# Altium footprint library TarabusLibrary.PcbLib: 591 footprints (part 37 of 37)
Each footprint in its own frame and in the unit in brackets; x right, y up, seen from the top. Pads: shape width x height; smd on the part's side, far side on the other; paste and mask are expansions set on the pad; w line width, h text height; cw(c..) or ccw(c..) is an arc to the next point about the centre after c.
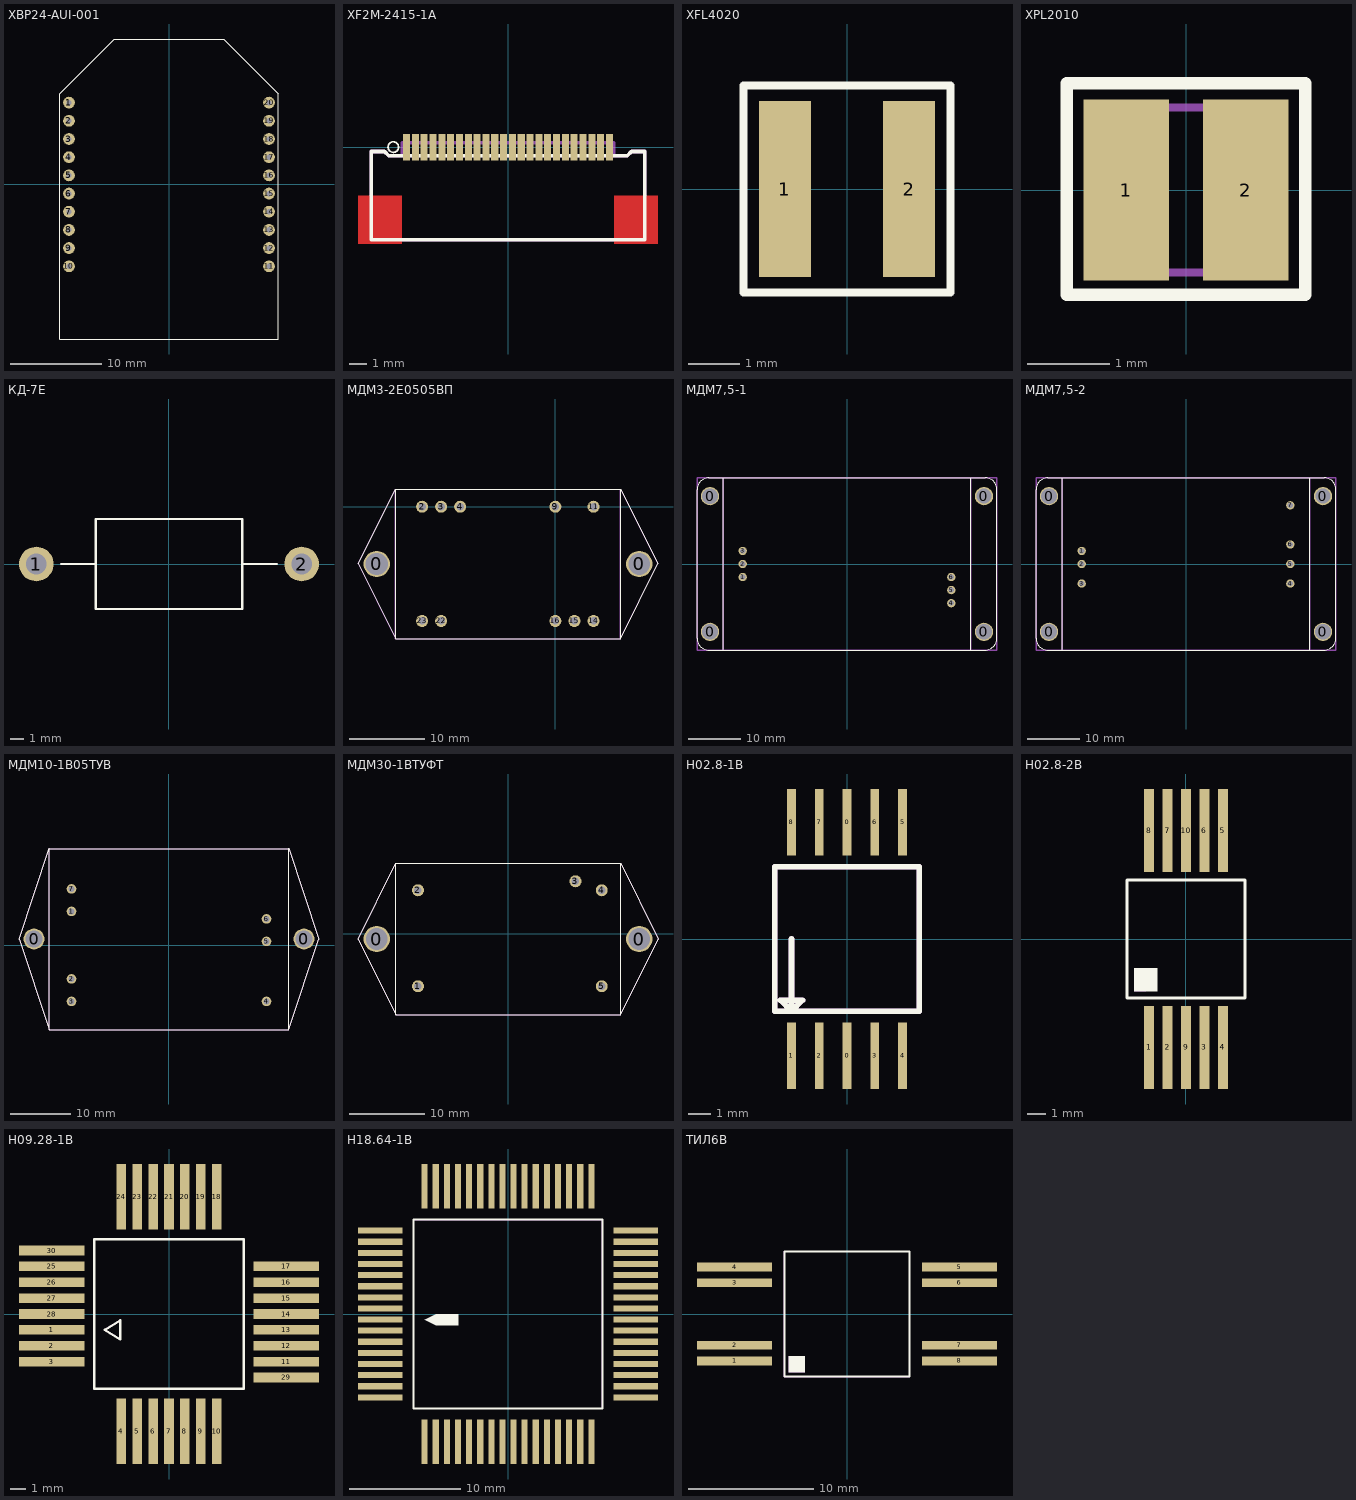
[diagram p36: the footprints below, top view; thin cyan lines are the x and y axes]

## XBP24-AUI-001 [mm]
pads (20):
  round 1.3 hole 0.6: 1(-11,9) 2(-11,7) 3(-11,5) 4(-11,3) 5(-11,1) 6(-11,-1) 7(-11,-3) 8(-11,-5) 9(-11,-7) 10(-11,-9) 11(11,-9) 12(11,-7) 13(11,-5) 14(11,-3) 15(11,-1) 16(11,1) 17(11,3) 18(11,5) 19(11,7) 20(11,9)
Top Overlay:
  lines w0.1: -12,10 -12,10 ; -12,10 -6,16 6,16 12,10 12,-17 -12,-17 -12,10
3D body "SW3dPS-XBEE Pro.STEP": height 13.2, standoff -0.39, extent -12.1,-16.37 12.28,16.57

## XF2M-2415-1A [mm] "Rotary backlock connector (0.5 mm)"
height 3.4
pads (24):
  rect 0.4x1.5 smd mask+0.02: 1(-5.75,0) 2(-5.25,0) 3(-4.75,0) 4(-4.25,0) 5(-3.75,0) 6(-3.25,0) 7(-2.75,0) 8(-2.25,0) 9(-1.75,0) 10(-1.25,0) 11(-0.75,0) 12(-0.25,0) 13(0.25,0) 14(0.75,0) 15(1.25,0) 16(1.75,0) 17(2.25,0) 18(2.75,0) 19(3.25,0) 20(3.75,0) 21(4.25,0) 22(4.75,0) 23(5.25,0) 24(5.75,0)
Top Layer:
  rectangle: 6,-5.5 8.5,-2.75
  rectangle: -8.5,-5.5 -6,-2.75
Top Overlay:
  circle w0.1: c-6.5,0 r0.301
  lines w0.2: -7.75,-5.25 7.75,-5.25 7.75,-0.25 7,-0.25 6.75,-0.5 -6.75,-0.5 -7,-0.25 -7.75,-0.25 -7.75,-5.25
Top Solder:
  rectangle: 6,-5.5 8.5,-2.75
  rectangle: -8.5,-5.5 -6,-2.75
Mechanical 7:
  lines w0.2: -6,-0.5 -6,0.25 6,0.25 6,-0.5 ; -7.75,-5.25 -7.75,-0.25 -7,-0.25 -6.75,-0.5 6.75,-0.5 7,-0.25 7.75,-0.25 7.75,-5.25 -7.75,-5.25
Mechanical 10:
  text ".Designator" at -8.025,1.125 h0.8
  text ".Comment" at -5.75,-5.75 h0.6
3D body: height 0.3, standoff 0, extent -5.9,-0.6 -5.6,0.35
3D body: height 0.3, standoff 0, extent -5.4,-0.6 -5.1,0.35
3D body: height 0.3, standoff 0, extent -4.4,-0.6 -4.1,0.35
3D body: height 0.3, standoff 0, extent -4.9,-0.6 -4.6,0.35
3D body: height 0.3, standoff 0, extent -2.9,-0.6 -2.6,0.35
3D body: height 0.3, standoff 0, extent -2.4,-0.6 -2.1,0.35
3D body: height 0.3, standoff 0, extent -3.4,-0.6 -3.1,0.35
3D body: height 0.3, standoff 0, extent -3.9,-0.6 -3.6,0.35
3D body: height 0.3, standoff 0, extent 0.1,-0.6 0.4,0.35
3D body: height 0.3, standoff 0, extent 0.6,-0.6 0.9,0.35
3D body: height 0.3, standoff 0, extent 1.6,-0.6 1.9,0.35
3D body: height 0.3, standoff 0, extent 1.1,-0.6 1.4,0.35
3D body: height 0.3, standoff 0, extent -0.9,-0.6 -0.6,0.35
3D body: height 0.3, standoff 0, extent -0.4,-0.6 -0.1,0.35
3D body: height 0.3, standoff 0, extent -1.4,-0.6 -1.1,0.35
3D body: height 0.3, standoff 0, extent -1.9,-0.6 -1.6,0.35
3D body: height 0.3, standoff 0, extent 4.1,-0.6 4.4,0.35
3D body: height 0.3, standoff 0, extent 4.6,-0.6 4.9,0.35
3D body: height 0.3, standoff 0, extent 5.6,-0.6 5.9,0.35
3D body: height 0.3, standoff 0, extent 5.1,-0.6 5.4,0.35
3D body: height 0.3, standoff 0, extent 3.1,-0.6 3.4,0.35
3D body: height 0.3, standoff 0, extent 3.6,-0.6 3.9,0.35
3D body: height 0.3, standoff 0, extent 2.6,-0.6 2.9,0.35
3D body: height 0.3, standoff 0, extent 2.1,-0.6 2.4,0.35
3D body: height 3.1, standoff 0, extent -7.65,-5.15 7.65,-0.575
3D body: height 0.2, standoff 0, extent -7.95,-4.85 -7.65,-3.35
3D body: height 0.2, standoff 0, extent 7.625,-4.85 7.925,-3.35

## XFL4020 [mm]
height 2.1
pads (2):
  rect 1x3.4 smd: 1(-1.2,0) 2(1.2,0)
Top Overlay:
  lines w0.15: -2,-2 2,-2 2,2 -2,2 -2,-2
Mechanical 7:
  lines w0.1: -2,-2 -2,2 2,2 2,-2 -2,-2
Mechanical 10:
  text ".Designator" at -1.5,2.5 h0.8
  text ".Comment" at -1,-3 h0.6
3D body: height 2, standoff 0, extent -2,-2 2,2

## XPL2010 [mm]
height 1
pads (2):
  rect 1.04x2.2 smd: 1(-0.725,0) 2(0.725,0)
Top Overlay:
  lines w0.15: -1.45,-1.275 1.45,-1.275 1.45,1.3 -1.45,1.3 -1.45,-1.275
Mechanical 7:
  lines w0.1: -0.95,1 -0.95,-1.005 0.95,-1.005 0.95,1.005 -0.95,1.005
Mechanical 10:
  text ".Comment" at -1.425,-1.875 h0.6
  text ".Designator" at -1.425,1.55 h0.8
3D body: height 1, standoff 0, extent -0.95,-1.005 0.95,1.005

## КД-7Е [mm]
pads (2):
  round 2.5 hole 1.5: 1(-9.6,0) 2(9.6,0)
Top Overlay:
  lines w0.15: -7.8,0 -5.3,0 ; 5.3,0 7.8,0 ; -5.3,-3.25 -5.3,3.25 5.3,3.25 5.3,-3.25 -5.3,-3.25
Mechanical 7:
  lines w0.1: -7.8,0 -5.3,0 ; 5.3,0 7.8,0 ; -5.3,-3.25 5.3,-3.25 5.3,3.25 -5.3,3.25 -5.3,-3.25
Mechanical 10:
  text ".Designator" at 0,5 h0.8
3D body: height 5, standoff 0.05, extent -5.3,-3.25 5.3,3.25

## МДМ3-2E0505ВП [mm]
height 8
pads (12):
  round 3.5 hole 3: 0(-23.82,-7.64)
  round 3.5 hole 2.9: 0(11.18,-7.64)
  round 1.6 hole 1: 2(-17.78,0) 3(-15.24,0) 4(-12.7,0) 9(0,0) 11(5.08,0) 14(5.08,-15.24) 15(2.54,-15.24) 16(0,-15.24) 22(-15.24,-15.24) 23(-17.78,-15.24)
Top Overlay:
  lines w0.15: 8.693,2.36 -21.32,2.36 ; -21.32,-17.64 -21.32,2.36 ; -21.32,-17.64 -26.32,-7.64 -21.32,2.36 ; -21.32,-17.64 8.68,-17.64 ; 8.68,-17.64 13.68,-7.64 8.68,2.36 8.68,-17.64
Mechanical 7:
  lines w0.1: -21.354,-17.64 8.681,-17.64 ; -21.331,2.36 8.685,2.36 ; -26.321,-7.64 -21.321,2.36 -21.321,-17.64 -26.321,-7.64 ; 8.679,-17.64 8.679,2.36 13.679,-7.64 8.679,-17.64
Mechanical 10:
  text ".Designator" at -8.4,3.8 h0.8
3D body: height 10, standoff 0.05, extent -21.3,-17.64 8.679,2.36
3D body: height 10, standoff 8, extent -26.32,-17.64 -21.3,2.36
3D body: height 10, standoff 8, extent 8.679,-17.64 13.679,2.36

## МДМ7,5-1 [mm]
height 10
pads (10):
  round 3.5 hole 3: 0(-26.25,-13) 0(-26.25,13) 0(26.25,-13)
  round 3.5 hole 2.9: 0(26.25,13)
  round 1.6 hole 1: 1(-20,-2.5) 2(-20,0) 3(-20,2.5) 4(20,-7.5) 5(20,-5) 6(20,-2.5)
Top Overlay:
  lines w0.2: -23.8,-16.5 -26.469,-16.5 cw(c-26.469,-14.219) -28.75,-14.219 -28.75,14.219 cw(c-26.469,14.219) -26.469,16.5 -23.75,16.5 ; 23.7,16.5 26.5,16.5 cw(c26.5,14.25) 28.75,14.25 28.75,-13.4 28.75,-14.202 cw(c26.451,-14.202) 26.451,-16.5 23.75,-16.5 ; -23.75,16.5 23.75,16.5 23.75,-16.5 ; -23.75,16.5 -23.75,-16.5 23.75,-16.5
Mechanical 7:
  lines w0.25: -23.75,-16.5 -28.75,-16.5 -28.75,16.5 -23.75,16.5 ; -23.75,-16.5 -23.75,16.5 ; -23.75,-16.5 23.75,-16.5 ; -23.75,16.5 23.75,16.5 ; 23.75,-16.5 28.75,-16.5 28.75,16.5 23.75,16.5 ; 23.75,-16.5 23.75,16.5
Mechanical 10:
  text ".Designator" at -1.2,19.3 h0.8
3D body: height 10, standoff 8, extent -28.75,-16.5 -23.75,16.5
3D body: height 10, standoff 8, extent 23.75,-16.5 28.75,16.5
3D body: height 10, standoff 0.05, extent -23.75,-16.5 23.75,16.5

## МДМ7,5-2 [mm]
height 10
pads (11):
  round 3.5 hole 3: 0(-26.25,-13) 0(-26.25,13) 0(26.25,-13)
  round 3.5 hole 2.9: 0(26.25,13)
  round 1.6 hole 1: 1(-20,2.5) 2(-20,0) 3(-20,-3.75) 4(20,-3.75) 5(20,0) 6(20,3.75) 7(20,11.25)
Top Overlay:
  lines w0.2: -23.8,-16.5 -26.469,-16.5 cw(c-26.469,-14.219) -28.75,-14.219 -28.75,14.219 cw(c-26.469,14.219) -26.469,16.5 -23.75,16.5 ; 23.7,16.5 26.5,16.5 cw(c26.5,14.25) 28.75,14.25 28.75,-13.4 28.75,-14.202 cw(c26.451,-14.202) 26.451,-16.5 23.75,-16.5 ; -23.75,16.5 23.75,16.5 23.75,-16.5 ; -23.75,16.5 -23.75,-16.5 23.75,-16.5
Mechanical 7:
  lines w0.25: -23.75,-16.5 -28.75,-16.5 -28.75,16.5 -23.75,16.5 ; -23.75,-16.5 -23.75,16.5 ; -23.75,-16.5 23.75,-16.5 ; -23.75,16.5 23.75,16.5 ; 23.75,-16.5 28.75,-16.5 28.75,16.5 23.75,16.5 ; 23.75,-16.5 23.75,16.5
Mechanical 10:
  text ".Designator" at -1.2,19.3 h0.8
3D body: height 10, standoff 8, extent -28.75,-16.5 -23.75,16.5
3D body: height 10, standoff 8, extent 23.75,-16.5 28.75,16.5
3D body: height 10, standoff 0.05, extent -23.75,-16.5 23.75,16.5

## МДМ10-1В05ТУВ [mm]
pads (9):
  round 3.5 hole 2.9: 0(-22.5,1.025) 0(22.5,1.025)
  round 1.6 hole 1: 1(-16.25,5.625) 2(-16.25,-5.625) 3(-16.25,-9.375) 4(16.25,-9.375) 5(16.25,0.625) 6(16.25,4.375) 7(-16.25,9.375)
Top Overlay:
  lines w0.15: -20,16.105 20,16.105 ; -20,-14.075 -25,1.025 -20,16.125 -20,-14.075 ; -20,-14.075 20,-14.075 ; 20,-14.075 25,1.025 20,16.125 20,-14.075
Mechanical 7:
  lines w0.1: -20,16.105 20,16.105 ; -20,-14.075 -20,16.125 -25,1.025 -20,-14.075 ; -20,-14.075 20,-14.075 ; 20,-14.075 20,16.125 25,1.025 20,-14.075
Mechanical 10:
  text ".Designator" at -0.44,1.96 h0.8
3D body: height 10, standoff 0.05, extent -20,-14.075 20,16.105
3D body: height 10, standoff 8, extent -25,-14.075 -19.975,16.1
3D body: height 10, standoff 8, extent 20,-14.05 25,16.075

## МДМ30-1ВТУФТ [mm]
pads (7):
  round 3.5 hole 2.9: 0(-17.5,-0.7) 0(17.5,-0.7)
  round 1.6 hole 1: 1(-12,-7) 2(-12,5.8) 3(9,7) 4(12.5,5.8) 5(12.5,-7)
Top Overlay:
  lines w0.15: -15,-10.8 -20,-0.7 -15,9.4 ; -15,-10.8 15,-10.8 ; -15,-10.8 -15,9.4 ; -15,9.4 15,9.4 ; 15,-10.8 20,-0.7 15,9.4 ; 15,-10.8 15,9.4
Mechanical 7:
  lines w0.1: -15,-10.8 -15,9.4 ; -15,-10.8 15,-10.8 ; -15,-10.8 -20,-0.7 -15,9.4 ; -15,9.4 15,9.4 ; 15,-10.8 15,9.4 ; 15,-10.8 20,-0.7 15,9.4
  text ".Designator" at -0.56,1.82 h0.8

## Н02.8-1В [mm]
height 2.9
pads (10):
  rect 0.4x3 smd: 0(0,-5.25) 0(0,5.25) 1(-2.5,-5.25) 2(-1.25,-5.25) 3(1.25,-5.25) 4(2.5,-5.25) 5(2.5,5.25) 6(1.25,5.25) 7(-1.25,5.25) 8(-2.5,5.25)
Top Overlay:
  lines w0.254: -2.5,0 -2.5,-3.25 ; -2.5,-3.25 -2,-2.75 -3,-2.75 -2.5,-3.25 ; -3.25,-3.25 3.25,-3.25 3.25,3.25 -3.25,3.25 -3.25,-3.25
Mechanical 7:
  lines w0.254: -2.5,0 -2.5,-3.25 ; -2.5,-3.25 -3,-2.75 -2,-2.75 -2.5,-3.25 ; -3.25,-3.25 -3.25,3.25 3.25,3.25 3.25,-3.25 -3.25,-3.25
3D body: height 2.9, standoff 0.05, extent -3.25,-3.25 3.25,3.25

## Н02.8-2B [mm]
pads (10):
  rect 0.55x4.5 smd: 1(-2,-5.875) 2(-1,-5.875) 3(1,-5.875) 4(2,-5.875) 5(2,5.875) 6(1,5.875) 7(-1,5.875) 8(-2,5.875) 9(0,-5.875) 10(0,5.875)
Top Overlay:
  region: -2.8,-1.575 -2.8,-2.825 -1.55,-2.825 -1.55,-1.575
  lines w0.15: -3.2,-3.2 3.2,-3.2 3.2,3.2 -3.2,3.2 -3.2,-3.2
Mechanical 7:
  region: -2.8,-2.2 -2.8,-2.83 -2.18,-2.83 -2.18,-2.2
  lines w0.1: -3.2,-3.2 -3.2,3.2 3.2,3.2 3.2,-3.2 -3.2,-3.2
  text ".Designator" at -0.84,0.89 h0.8

## Н09.28-1B [mm]
pads (30):
  rect 4.14x0.6 smd: 1(-7.38,-1) 2(-7.38,-2) 3(-7.38,-3) 11(7.38,-3) 12(7.38,-2) 13(7.38,-1) 14(7.38,0) 15(7.38,1) 16(7.38,2) 17(7.38,3) 25(-7.38,3) 26(-7.38,2) 27(-7.38,1) 28(-7.38,0) 29(7.38,-4) 30(-7.38,4)
  rect 0.6x4.14 smd: 4(-3,-7.38) 5(-2,-7.38) 6(-1,-7.38) 7(0,-7.38) 8(1,-7.38) 9(2,-7.38) 10(3,-7.38) 18(3,7.38) 19(2,7.38) 20(1,7.38) 21(0,7.38) 22(-1,7.38) 23(-2,7.38) 24(-3,7.38)
Top Overlay:
  lines w0.15: -4.7,-4.7 4.7,-4.7 4.7,4.7 -4.7,4.7 -4.7,-4.7 ; -4.06,-1 -3.06,-0.4 -3.06,-1.6 -4.06,-1
Mechanical 7:
  lines w0.1: -4.7,-4.7 -4.7,4.7 4.7,4.7 4.7,-4.7 -4.7,-4.7 ; -4.06,-1 -3.06,-1.6 -3.06,-0.4 -4.06,-1
  text ".Designator" at -0.69,1.01 h0.8

## Н18.64-1B [mm]
pads (64):
  rect 4x0.55 smd: 1(-11.5,-0.5) 2(-11.5,-1.5) 3(-11.5,-2.5) 4(-11.5,-3.5) 5(-11.5,-4.5) 6(-11.5,-5.5) 7(-11.5,-6.5) 8(-11.5,-7.5) 25(11.5,-7.5) 26(11.5,-6.5) 27(11.5,-5.5) 28(11.5,-4.5) 29(11.5,-3.5) 30(11.5,-2.5) 31(11.5,-1.5) 32(11.5,-0.5) 33(11.5,0.5) 34(11.5,1.5) 35(11.5,2.5) 36(11.5,3.5) 37(11.5,4.5) 38(11.5,5.5) 39(11.5,6.5) 40(11.5,7.5) 57(-11.5,7.5) 58(-11.5,6.5) 59(-11.5,5.5) 60(-11.5,4.5) 61(-11.5,3.5) 62(-11.5,2.5) 63(-11.5,1.5) 64(-11.5,0.5)
  rect 0.55x4 smd: 9(-7.5,-11.5) 10(-6.5,-11.5) 11(-5.5,-11.5) 12(-4.5,-11.5) 13(-3.5,-11.5) 14(-2.5,-11.5) 15(-1.5,-11.5) 16(-0.5,-11.5) 17(0.5,-11.5) 18(1.5,-11.5) 19(2.5,-11.5) 20(3.5,-11.5) 21(4.5,-11.5) 22(5.5,-11.5) 23(6.5,-11.5) 24(7.5,-11.5) 41(7.5,11.5) 42(6.5,11.5) 43(5.5,11.5) 44(4.5,11.5) 45(3.5,11.5) 46(2.5,11.5) 47(1.5,11.5) 48(0.5,11.5) 49(-0.5,11.5) 50(-1.5,11.5) 51(-2.5,11.5) 52(-3.5,11.5) 53(-4.5,11.5) 54(-5.5,11.5) 55(-6.5,11.5) 56(-7.5,11.5)
Top Overlay:
  region: -6.5,-1 -4.5,-1 -4.5,0 -6.5,0 -7.5,-0.5
  lines w0.15: -8.5,-8.5 -8.5,8.5 8.5,8.5 8.5,-8.5 -8.5,-8.5
Mechanical 7:
  region: -6.5,-0.85 -5.5,-0.85 -5.5,-0.15 -6.51,-0.15 -7.5,-0.5
  lines w0.1: -8.5,-8.5 8.5,-8.5 8.5,8.5 -8.5,8.5 -8.5,-8.5
  text ".Designator" at -0.32,1.25 h0.8

## ТИЛ6В [mm]
pads (8):
  rect 6x0.7 smd: 1(-9,-3.75) 2(-9,-2.5) 3(-9,2.5) 4(-9,3.75) 5(9,3.75) 6(9,2.5) 7(9,-2.5) 8(9,-3.75)
Top Overlay:
  region: -3.396,-3.395 -4.646,-3.395 -4.646,-4.645 -3.396,-4.645
  lines w0.15: -5,-5 -5,5 5,5 5,-5 -5,-5
Mechanical 7:
  region: -3.396,-3.395 -4.646,-3.395 -4.646,-4.645 -3.396,-4.645
  lines w0.1: -5,-5 5,-5 5,5 -5,5 -5,-5
  text ".Designator" at -0.52,1.18 h0.8